# Altium integrated library Miscellaneous Devices LC.IntLib: 333 symbols (part 1 of 3) (continued)
## LMV321IDBVRG4_[C7972] (continued)
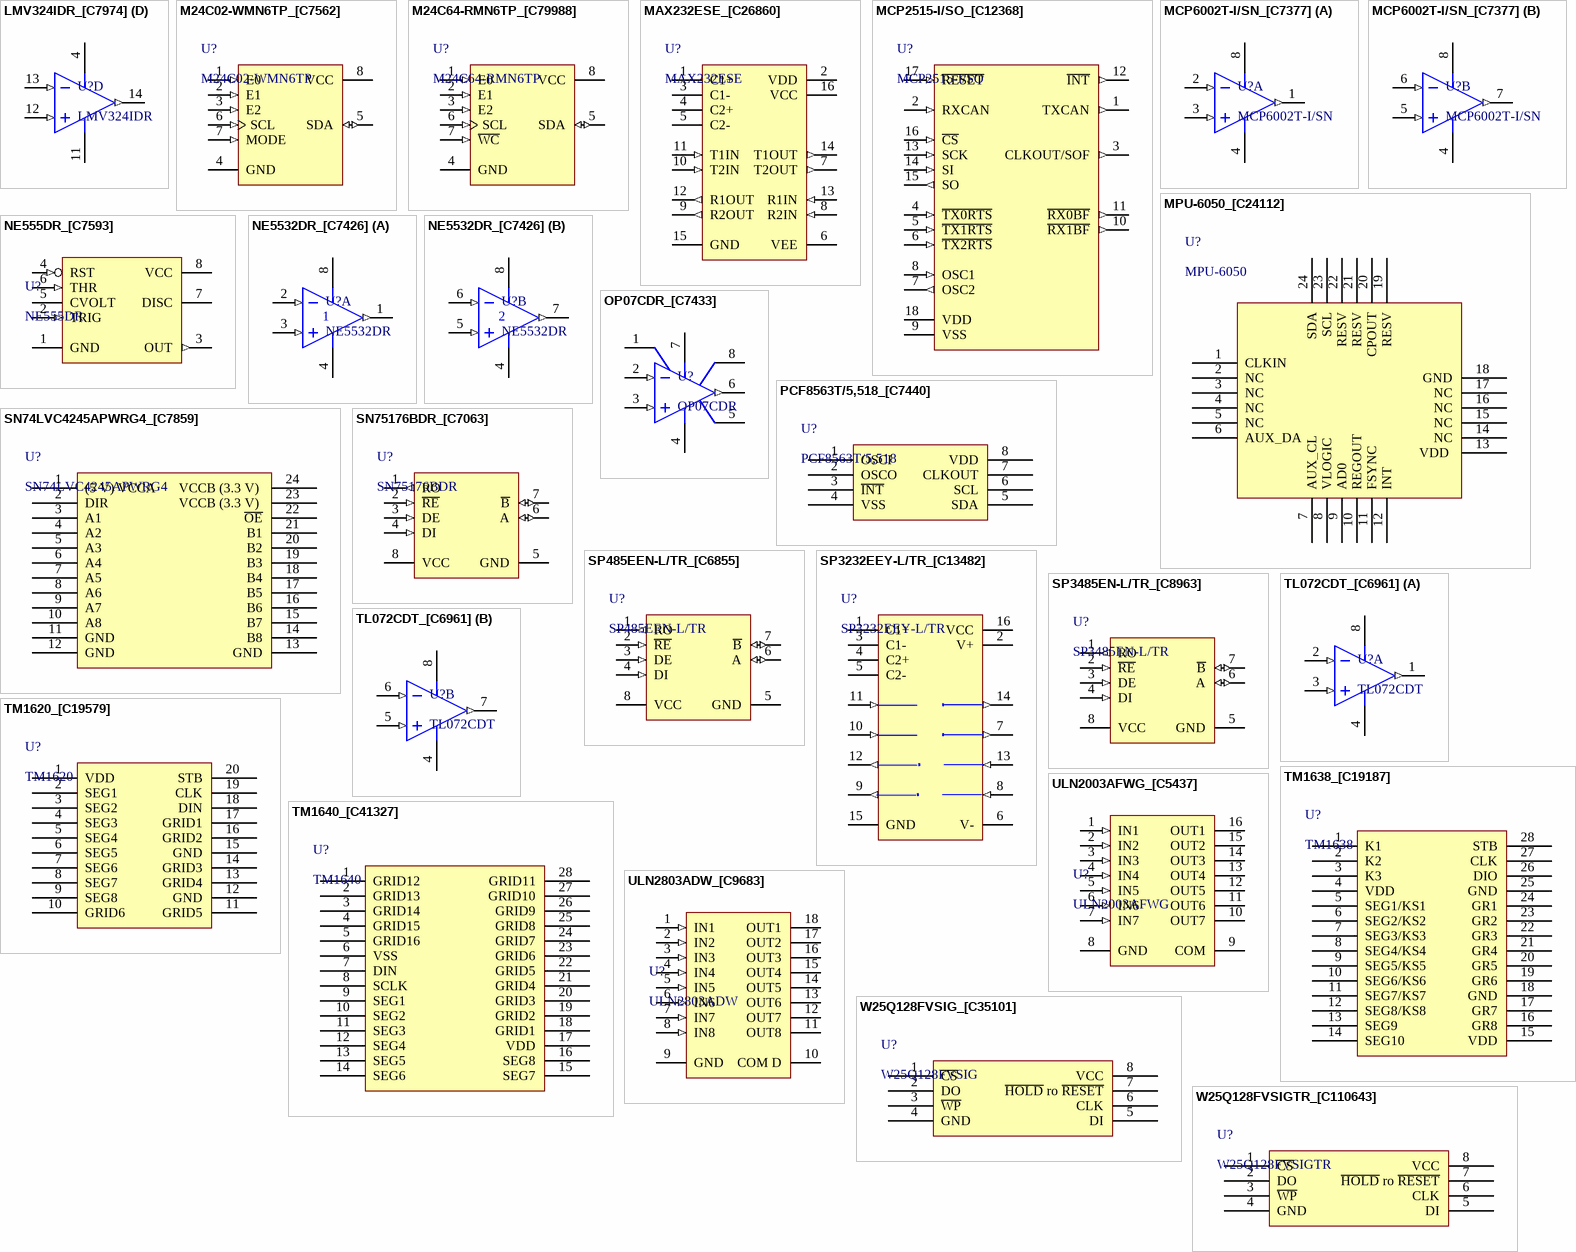
[diagram p4: symbols LMV324IDR_[C7974] to W25Q128FVSIGTR_[C110643]]

## LMV324IDR_[C7974]
designator U?, comment LMV324IDR
运放; ComponentLink1Description: 供应商链接; ComponentLink1URL: http://www.szlcsc.com/product/details_8451.html; Package: SOIC-14_150mil; Supplier: LC; SuppliersPartNumber: C7974
footprint SOIC-14_150mil
pins on every part: 4 V+ (power), 11 V- (power)
part A pins: 1 OUTA (out), 2 INA- (in), 3 INA+ (in)
part B pins: 5 INB+ (in), 6 INB- (in), 7 OUTB (out)
part C pins: 8 OUTC (out), 9 INC- (in), 10 INC+ (in)
part D pins: 12 IND+ (in), 13 IND- (in), 14 OUTD (out)

## M24C02-WMN6TP_[C7562]
designator U?, comment M24C02-WMN6TP
EEPROM; ComponentLink1Description: 供应商链接; ComponentLink1URL: http://www.szlcsc.com/product/details_8039.html; Package: SOIC-8_150mil; Supplier: LC; SuppliersPartNumber: C7562
footprint SOIC-8_150mil
pins: 1 E0 (in), 2 E1 (in), 3 E2 (in), 4 GND (power), 5 SDA (io), 6 SCL (in), 7 MODE (in), 8 VCC (power)

## M24C64-RMN6TP_[C79988]
designator U?, comment M24C64-RMN6TP
EEPROM; ComponentLink1Description: 供应商链接; ComponentLink1URL: http://www.szlcsc.com/product/details_81133.html; Package: SOIC-8_150mil; Supplier: LC; SuppliersPartNumber: C79988
footprint SOIC-8_150mil
pins: 1 E0 (in), 2 E1 (in), 3 E2 (in), 4 GND (power), 5 SDA (io), 6 SCL (in), 7 ~{WC} (in), 8 VCC (power)

## MAX232ESE_[C26860]
designator U?, comment MAX232ESE
RS232; ComponentLink1Description: 供应商链接; ComponentLink1URL: http://www.szlcsc.com/product/details_27608.html; Package: SOIC-16_150mil; Supplier: LC; SuppliersPartNumber: C26860
footprint SOIC-16_150mil
pins: 1 C1+, 2 VDD (power), 3 C1-, 4 C2+, 5 C2-, 6 VEE (power), 7 T2OUT (out), 8 R2IN (in), 9 R2OUT (out), 10 T2IN (in), 11 T1IN (in), 12 R1OUT (out), 13 R1IN (in), 14 T1OUT (out), 15 GND (power), 16 VCC (power)

## MCP2515-I/SO_[C12368]
designator U?, comment MCP2515-I/SO
CAN; ComponentLink1Description: 供应商链接; ComponentLink1URL: http://www.szlcsc.com/product/details_12992.html; Package: SOIC-18_300mil; Supplier: LC; SuppliersPartNumber: C12368
footprint SOIC-18_300mil
pins: 1 TXCAN (out), 2 RXCAN (in), 3 CLKOUT/SOF (out), 4 ~{TX0RTS} (in), 5 ~{TX1RTS} (in), 6 ~{TX2RTS} (in), 7 OSC2 (out), 8 OSC1 (in), 9 VSS (power), 10 ~{RX1BF} (out), 11 ~{RX0BF} (out), 12 ~{INT} (out), 13 SCK (in), 14 SI (in), 15 SO (out), 16 ~{CS} (in), 17 ~{RESET} (in), 18 VDD (power)

## MCP6002T-I/SN_[C7377]
designator U?, comment MCP6002T-I/SN
运放; ComponentLink1Description: 供应商链接; ComponentLink1URL: http://www.szlcsc.com/product/details_7854.html; Package: SOIC-8_150mil; Supplier: LC; SuppliersPartNumber: C7377
footprint SOIC-8_150mil
pins on every part: 4 VSS (power), 8 VDD (power)
part A pins: 1 VOUTA (out), 2 VINA- (in), 3 VINA+ (in)
part B pins: 5 VINB+ (in), 6 VINB- (in), 7 VOUTB (out)

## MPU-6050_[C24112]
designator U?, comment MPU-6050
传感器; ComponentLink1Description: 供应商链接; ComponentLink1URL: http://www.szlcsc.com/product/details_24852.html; Package: QFN-24_4x4x05P; Supplier: LC; SuppliersPartNumber: C24112
footprint QFN-24_4x4x05P
pins: 1 CLKIN, 2 NC, 3 NC, 4 NC, 5 NC, 6 AUX_DA, 7 AUX_CL, 8 VLOGIC, 9 AD0, 10 REGOUT, 11 FSYNC, 12 INT, 13 VDD , 14 NC, 15 NC, 16 NC, 17 NC, 18 GND, 19 RESV, 20 CPOUT, 21 RESV, 22 RESV, 23 SCL, 24 SDA

## NE555DR_[C7593]
designator U?, comment NE555DR
时基集成; ComponentLink1Description: 供应商链接; ComponentLink1URL: http://www.szlcsc.com/product/details_8070.html; Package: SOIC-8_150mil; Supplier: LC; SuppliersPartNumber: C7593
footprint SOIC-8_150mil
pins: 1 GND (power), 2 TRIG (in), 3 OUT (out), 4 RST (in), 5 CVOLT, 6 THR (in), 7 DISC (oc), 8 VCC (power)

## NE5532DR_[C7426]
designator U?, comment NE5532DR
功放; ComponentLink1Description: 供应商链接; ComponentLink1URL: http://www.szlcsc.com/product/details_7903.html; Package: SOIC-8_150mil; Supplier: LC; SuppliersPartNumber: C7426
footprint SOIC-8_150mil
pins on every part: 4 V- (power), 8 V+ (power)
part A pins: 1 OUT (out), 2 IN- (in), 3 IN+ (in)
part B pins: 5 IN+ (in), 6 IN- (in), 7 OUT (out)

## OP07CDR_[C7433]
designator U?, comment OP07CDR
精密运放; ComponentLink1Description: 供应商链接; ComponentLink1URL: http://www.szlcsc.com/product/details_7910.html; Package: SOIC-8; Supplier: LC; SuppliersPartNumber: C7433
footprint SOIC-8_150mil
pins: 1 VOSTRIM, 2 IN- (in), 3 IN+ (in), 4 V- (power), 5 NC, 6 OUT (out), 7 V+ (power), 8 VOSTRIM

## PCF8563T/5,518_[C7440]
designator U?, comment PCF8563T/5,518
实时时钟; ComponentLink1Description: 供应商链接; ComponentLink1URL: http://www.szlcsc.com/product/details_7917.html; Package: SOIC-8_150mil; Supplier: LC; SuppliersPartNumber: C7440
footprint SOIC-8_150mil
pins: 1 OSCI, 2 OSCO, 3 ~{INT}, 4 VSS, 5 SDA, 6 SCL, 7 CLKOUT, 8 VDD

## SN74LVC4245APWRG4_[C7859]
designator U?, comment SN74LVC4245APWRG4
74系列逻辑芯片; ComponentLink1Description: 供应商链接; ComponentLink1URL: http://www.szlcsc.com/product/details_8336.html; Package: TSSOP-24; Supplier: LC; SuppliersPartNumber: C7859
footprint TSSOP-24
pins: 1 (5 V) VCCA, 2 DIR, 3 A1, 4 A2, 5 A3, 6 A4, 7 A5, 8 A6, 9 A7, 10 A8, 11 GND, 12 GND, 13 GND, 14 B8, 15 B7, 16 B6, 17 B5, 18 B4, 19 B3, 20 B2, 21 B1, 22 ~{OE}, 23 VCCB (3.3 V) , 24 VCCB (3.3 V) 

## SN75176BDR_[C7063]
designator U?, comment SN75176BDR
RS-485/RS-422; ComponentLink1Description: 供应商链接; ComponentLink1URL: http://www.szlcsc.com/product/details_7535.html; Package: SOIC-8_150mil; Supplier: LC; SuppliersPartNumber: C7063
footprint SOIC-8_150mil
pins: 1 RO (out), 2 ~{RE} (in), 3 DE (in), 4 DI (in), 5 GND (power), 6 A (io), 7 ~{B} (io), 8 VCC (power)

## SP485EEN-L/TR_[C6855]
designator U?, comment SP485EEN-L/TR
RS-485/RS-422; ComponentLink1Description: 供应商链接; ComponentLink1URL: http://www.szlcsc.com/product/details_7327.html; Package: SOIC-8; Supplier: LC; SuppliersPartNumber: C6855
footprint SOIC-8_150mil
pins: 1 RO (out), 2 ~{RE} (in), 3 DE (in), 4 DI (in), 5 GND (power), 6 A (io), 7 ~{B} (io), 8 VCC (power)

## SP3232EEY-L/TR_[C13482]
designator U?, comment SP3232EEY-L/TR
RS232; ComponentLink1Description: 供应商链接; ComponentLink1URL: http://www.szlcsc.com/product/details_14131.html; Package: TSSOP-16; Supplier: LC; SuppliersPartNumber: C13482
footprint TSSOP-16
pins: 1 C1+, 2 V+ (power), 3 C1-, 4 C2+, 5 C2-, 6 V- (power), 7 T2OUT (out), 8 R2IN (in), 9 R2OUT (out), 10 T2IN (in), 11 T1IN (in), 12 R1OUT (out), 13 R1IN (in), 14 T1OUT (out), 15 GND (power), 16 VCC (power)

## SP3485EN-L/TR_[C8963]
designator U?, comment SP3485EN-L/TR
RS-485/RS-422; ComponentLink1Description: 供应商链接; ComponentLink1URL: http://www.szlcsc.com/product/details_9482.html; Package: SOIC-8; Supplier: LC; SuppliersPartNumber: C8963
footprint SOIC-8_150mil
pins: 1 RO (out), 2 ~{RE} (in), 3 DE (in), 4 DI (in), 5 GND (power), 6 A (io), 7 ~{B} (io), 8 VCC (power)

## TL072CDT_[C6961]
designator U?, comment TL072CDT
运放; ComponentLink1Description: 供应商链接; ComponentLink1URL: http://www.szlcsc.com/product/details_7433.html; Package: SOIC-8_150mil; Supplier: LC; SuppliersPartNumber: C6961
footprint SOIC-8_150mil
pins on every part: 4 V- (power), 8 V+ (power)
part A pins: 1 OUT (out), 2 IN- (in), 3 IN+ (in)
part B pins: 5 IN+ (in), 6 IN- (in), 7 OUT (out)

## TM1620_[C19579]
designator U?, comment TM1620
LED驱动; ComponentLink1Description: 供应商链接; ComponentLink1URL: http://www.szlcsc.com/product/details_20288.html; Package: SOIC-20_300mil; Supplier: LC; SuppliersPartNumber: C19579
footprint SOIC-20_300mil
pins: 1 VDD, 2 SEG1, 3 SEG2, 4 SEG3, 5 SEG4, 6 SEG5, 7 SEG6, 8 SEG7, 9 SEG8, 10 GRID6, 11 GRID5, 12 GND, 13 GRID4, 14 GRID3, 15 GND, 16 GRID2, 17 GRID1, 18 DIN, 19 CLK, 20 STB

## TM1638_[C19187]
designator U?, comment TM1638
LED驱动; ComponentLink1Description: 供应商链接; ComponentLink1URL: http://www.szlcsc.com/product/details_19892.html; Package: SOIC-28_300mil; Supplier: LC; SuppliersPartNumber: C19187
footprint SOIC-28_300mil
pins: 1 K1, 2 K2, 3 K3, 4 VDD, 5 SEG1/KS1, 6 SEG2/KS2, 7 SEG3/KS3, 8 SEG4/KS4, 9 SEG5/KS5, 10 SEG6/KS6, 11 SEG7/KS7, 12 SEG8/KS8, 13 SEG9, 14 SEG10, 15 VDD, 16 GR8, 17 GR7, 18 GND, 19 GR6, 20 GR5, 21 GR4, 22 GR3, 23 GR2, 24 GR1, 25 GND, 26 DIO, 27 CLK, 28 STB

## TM1640_[C41327]
designator U?, comment TM1640
LED驱动; ComponentLink1Description: 供应商链接; ComponentLink1URL: http://www.szlcsc.com/product/details_42311.html; Package: SOP-28_300mil; Supplier: LC; SuppliersPartNumber: C41327
footprint SOP-28_300mil
pins: 1 GRID12, 2 GRID13, 3 GRID14, 4 GRID15, 5 GRID16, 6 VSS, 7 DIN, 8 SCLK, 9 SEG1, 10 SEG2, 11 SEG3, 12 SEG4, 13 SEG5, 14 SEG6, 15 SEG7, 16 SEG8, 17 VDD, 18 GRID1, 19 GRID2, 20 GRID3, 21 GRID4, 22 GRID5, 23 GRID6, 24 GRID7, 25 GRID8, 26 GRID9, 27 GRID10, 28 GRID11

## ULN2003AFWG_[C5437]
designator U?, comment ULN2003AFWG
大电流驱动; ComponentLink1Description: 供应商链接; ComponentLink1URL: http://www.szlcsc.com/product/details_5880.html; Package: SOIC-16_150mil; Supplier: LC; SuppliersPartNumber: C5437
footprint SOIC-16_150mil
pins: 1 IN1 (in), 2 IN2 (in), 3 IN3 (in), 4 IN4 (in), 5 IN5 (in), 6 IN6 (in), 7 IN7 (in), 8 GND (power), 9 COM, 10 OUT7 (oc), 11 OUT6 (oc), 12 OUT5 (oc), 13 OUT4 (oc), 14 OUT3 (oc), 15 OUT2 (oc), 16 OUT1 (oc)

## ULN2803ADW_[C9683]
designator U?, comment ULN2803ADW
大电流驱动; ComponentLink1Description: 供应商链接; ComponentLink1URL: http://www.szlcsc.com/product/details_10213.html; Package: SOIC-18_300mil; Supplier: LC; SuppliersPartNumber: C9683
footprint SOIC-18_300mil
pins: 1 IN1 (in), 2 IN2 (in), 3 IN3 (in), 4 IN4 (in), 5 IN5 (in), 6 IN6 (in), 7 IN7 (in), 8 IN8 (in), 9 GND (power), 10 COM D, 11 OUT8 (oc), 12 OUT7 (oc), 13 OUT6 (oc), 14 OUT5 (oc), 15 OUT4 (oc), 16 OUT3 (oc), 17 OUT2 (oc), 18 OUT1 (oc)

## W25Q128FVSIG_[C35101]
designator U?, comment W25Q128FVSIG
Flash ROM; ComponentLink1Description: 供应商链接; ComponentLink1URL: http://www.szlcsc.com/product/details_36072.html; Package: SOIC-8; Supplier: LC; SuppliersPartNumber: C35101
footprint SOIC-8_208mil
pins: 1 ~{CS}, 2 DO, 3 ~{WP}, 4 GND, 5 DI, 6 CLK, 7 ~{HOLD} ro ~{RESET}, 8 VCC

## W25Q128FVSIGTR_[C110643]
designator U?, comment W25Q128FVSIGTR
Flash ROM; ComponentLink1Description: 供应商链接; ComponentLink1URL: http://www.szlcsc.com/product/details_111868.html; Package: SOIC-8; Supplier: LC; SuppliersPartNumber: C110643
footprint SOIC-8_208mil
pins: 1 ~{CS}, 2 DO, 3 ~{WP}, 4 GND, 5 DI, 6 CLK, 7 ~{HOLD} ro ~{RESET}, 8 VCC

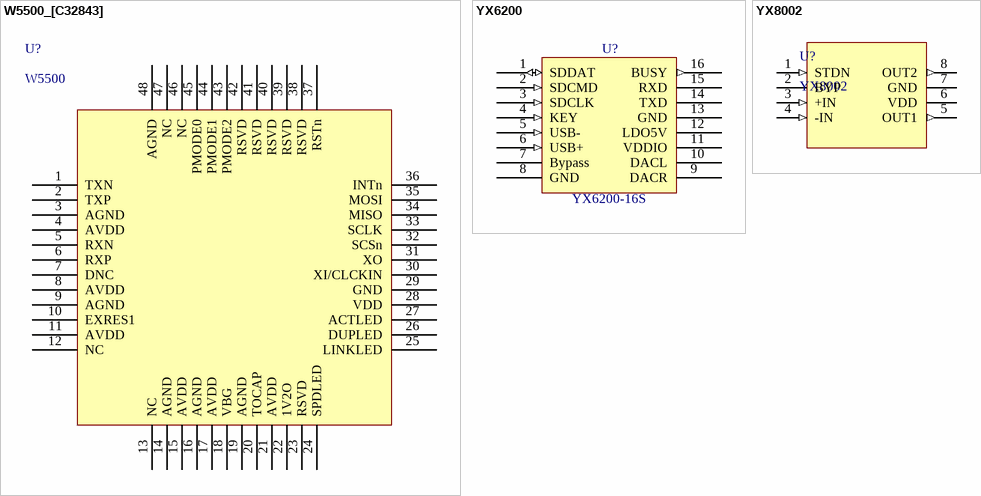
[diagram p5: symbols W5500_[C32843] to YX8002]

## W5500_[C32843]
designator U?, comment W5500
以太网; ComponentLink1Description: 供应商链接; ComponentLink1URL: http://www.szlcsc.com/product/details_33808.html; Package: LQFP-48_7x7x05P; Supplier: LC; SuppliersPartNumber: C32843
footprint LQFP-48_7x7x05P
pins: 1 TXN, 2 TXP, 3 AGND, 4 AVDD, 5 RXN, 6 RXP, 7 DNC, 8 AVDD, 9 AGND, 10 EXRES1, 11 AVDD, 12 NC, 13 NC, 14 AGND, 15 AVDD, 16 AGND, 17 AVDD, 18 VBG, 19 AGND, 20 TOCAP, 21 AVDD, 22 1V2O, 23 RSVD, 24 SPDLED, 25 LINKLED, 26 DUPLED, 27 ACTLED, 28 VDD, 29 GND, 30 XI/CLCKIN, 31 XO, 32 SCSn, 33 SCLK, 34 MISO, 35 MOSI, 36 INTn, 37 RSTn, 38 RSVD, 39 RSVD, 40 RSVD, 41 RSVD, 42 RSVD, 43 PMODE2, 44 PMODE1, 45 PMODE0, 46 NC, 47 NC, 48 AGND

## YX6200
designator U?, comment YX6200-16S
ComponentLink1Description: 生产商; ComponentLink1URL: https://www.yxin18.com/product/product-11-892.html
footprint SOP-16_150mil
pins: 1 SDDAT (io), 2 SDCMD (in), 3 SDCLK (in), 4 KEY (in), 5 USB- (in), 6 USB+ (in), 7 Bypass, 8 GND (power), 9 DACR, 10 DACL, 11 VDDIO, 12 LDO5V, 13 GND, 14 TXD, 15 RXD, 16 BUSY (out)
2 alternate drawings of the same symbol

## YX8002
designator U?
音频功放; Package: SOIC-8_150mil; Supplier: LC; SuppliersPartNumber: C7593
footprint SOIC-8_150mil
pins: 1 STDN (in), 2 BYP, 3 +IN (in), 4 -IN (in), 5 OUT1 (out), 6 VDD (power), 7 GND (power), 8 OUT2 (out)


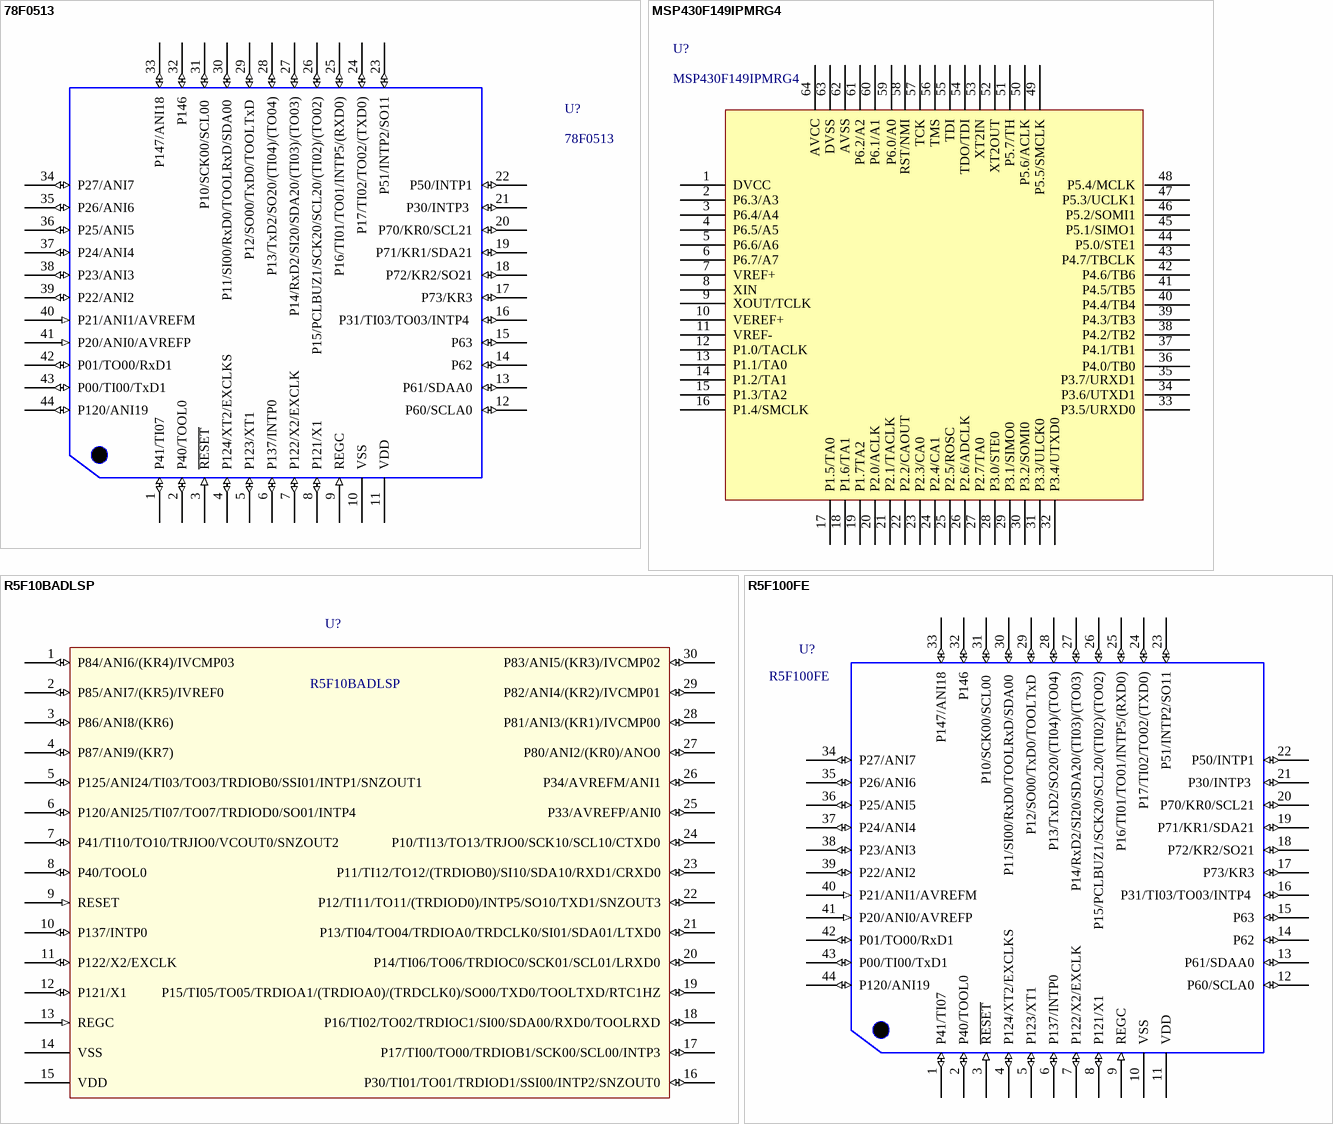
[diagram p6: symbols 78F0513 to R5F100FE]

## 78F0513
designator U?
MCU
footprint QFP10X10-G44/P.8N
pins: 1 P41/TI07  (io), 2 P40/TOOL0 (io), 3 ~{RESET} (in), 4 P124/XT2/EXCLKS (io), 5 P123/XT1 (io), 6 P137/INTP0 (io), 7 P122/X2/EXCLK (io), 8 P121/X1 (io), 9 REGC (in), 10 VSS (power), 11 VDD (power), 12 P60/SCLA0 (io), 13 P61/SDAA0 (io), 14 P62 (io), 15 P63 (io), 16 P31/TI03/TO03/INTP4  (io), 17 P73/KR3 (io), 18 P72/KR2/SO21 (io), 19 P71/KR1/SDA21 (io), 20 P70/KR0/SCL21 (io), 21 P30/INTP3  (io), 22 P50/INTP1 (io), 23 P51/INTP2/SO11 (io), 24 P17/TI02/TO02/(TXD0) (io), 25 P16/TI01/TO01/INTP5/(RXD0) (io), 26 P15/PCLBUZ1/SCK20/SCL20/(TI02)/(TO02) (io), 27 P14/RxD2/SI20/SDA20/(TI03)/(TO03) (io), 28 P13/TxD2/SO20/(TI04)/(TO04) (io), 29 P12/SO00/TxD0/TOOLTxD  (io), 30 P11/SI00/RxD0/TOOLRxD/SDA00  (io), 31 P10/SCK00/SCL00  (io), 32 P146 (io), 33 P147/ANI18 (io), 34 P27/ANI7 (io), 35 P26/ANI6 (io), 36 P25/ANI5 (io), 37 P24/ANI4 (io), 38 P23/ANI3 (io), 39 P22/ANI2 (io), 40 P21/ANI1/AVREFM (in), 41 P20/ANI0/AVREFP (in), 42 P01/TO00/RxD1 (io), 43 P00/TI00/TxD1 (io), 44 P120/ANI19 (io)

## MSP430F149IPMRG4
designator U?
MCU; ComponentLink1Description: 供应商链接; ComponentLink1URL: http://www.szlcsc.com/product/details_8068.html; Package: LQFP-64_10x10x05P; Supplier: LC; SuppliersPartNumber: C7591
footprint LQFP-64_10x10x05P_Q2 (编带PIN1 在 Q2)
pins: 1 DVCC, 2 P6.3/A3, 3 P6.4/A4, 4 P6.5/A5, 5 P6.6/A6, 6 P6.7/A7, 7 VREF+, 8 XIN, 9 XOUT/TCLK, 10 VEREF+, 11 VREF-, 12 P1.0/TACLK, 13 P1.1/TA0, 14 P1.2/TA1, 15 P1.3/TA2, 16 P1.4/SMCLK, 17 P1.5/TA0, 18 P1.6/TA1, 19 P1.7TA2, 20 P2.0/ACLK, 21 P2.1/TACLK, 22 P2.2/CAOUT, 23 P2.3/CA0, 24 P2.4/CA1, 25 P2.5/ROSC, 26 P2.6/ADCLK, 27 P2.7/TA0, 28 P3.0/STE0, 29 P3.1/SIMO0, 30 P3.2/SOMI0, 31 P3.3/ULCK0, 32 P3.4/UTXD0, 33 P3.5/URXD0, 34 P3.6/UTXD1, 35 P3.7/URXD1, 36 P4.0/TB0, 37 P4.1/TB1, 38 P4.2/TB2, 39 P4.3/TB3, 40 P4.4/TB4, 41 P4.5/TB5, 42 P4.6/TB6, 43 P4.7/TBCLK, 44 P5.0/STE1, 45 P5.1/SIMO1, 46 P5.2/SOMI1, 47 P5.3/UCLK1, 48 P5.4/MCLK, 49 P5.5/SMCLK, 50 P5.6/ACLK, 51 P5.7/TH, 52 XT2OUT, 53 XT2IN, 54 TDO/TDI, 55 TDI, 56 TMS, 57 TCK, 58 RST/NMI, 59 P6.0/A0, 60 P6.1/A1, 61 P6.2/A2, 62 AVSS, 63 DVSS, 64 AVCC

## R5F10BADLSP
designator U?
MCU
pins: 1 P84/ANI6/(KR4)/IVCMP03 (io), 2 P85/ANI7/(KR5)/IVREF0 (io), 3 P86/ANI8/(KR6) (io), 4 P87/ANI9/(KR7) (io), 5 P125/ANI24/TI03/TO03/TRDIOB0/SSI01/INTP1/SNZOUT1 (io), 6 P120/ANI25/TI07/TO07/TRDIOD0/SO01/INTP4 (io), 7 P41/TI10/TO10/TRJIO0/VCOUT0/SNZOUT2 (io), 8 P40/TOOL0 (io), 9 RESET (in), 10 P137/INTP0 (io), 11 P122/X2/EXCLK (io), 12 P121/X1 (io), 13 REGC (in), 14 VSS (power), 15 VDD (power), 16 P30/TI01/TO01/TRDIOD1/SSI00/INTP2/SNZOUT0 (io), 17 P17/TI00/TO00/TRDIOB1/SCK00/SCL00/INTP3 (io), 18 P16/TI02/TO02/TRDIOC1/SI00/SDA00/RXD0/TOOLRXD (io), 19 P15/TI05/TO05/TRDIOA1/(TRDIOA0)/(TRDCLK0)/SO00/TXD0/TOOLTXD/RTC1HZ (io), 20 P14/TI06/TO06/TRDIOC0/SCK01/SCL01/LRXD0 (io), 21 P13/TI04/TO04/TRDIOA0/TRDCLK0/SI01/SDA01/LTXD0 (io), 22 P12/TI11/TO11/(TRDIOD0)/INTP5/SO10/TXD1/SNZOUT3 (io), 23 P11/TI12/TO12/(TRDIOB0)/SI10/SDA10/RXD1/CRXD0 (io), 24 P10/TI13/TO13/TRJO0/SCK10/SCL10/CTXD0 (io), 25 P33/AVREFP/ANI0 (io), 26 P34/AVREFM/ANI1 (io), 27 P80/ANI2/(KR0)/ANO0 (io), 28 P81/ANI3/(KR1)/IVCMP00 (io), 29 P82/ANI4/(KR2)/IVCMP01 (io), 30 P83/ANI5/(KR3)/IVCMP02 (io)

## R5F100FE
designator U?
MCU; Supplier 1: Digi-Key
footprint LQFP-44_10X10-G44/P.8N
pins: 1 P41/TI07  (io), 2 P40/TOOL0 (io), 3 ~{RESET} (in), 4 P124/XT2/EXCLKS (io), 5 P123/XT1 (io), 6 P137/INTP0 (io), 7 P122/X2/EXCLK (io), 8 P121/X1 (io), 9 REGC (in), 10 VSS (power), 11 VDD (power), 12 P60/SCLA0 (io), 13 P61/SDAA0 (io), 14 P62 (io), 15 P63 (io), 16 P31/TI03/TO03/INTP4  (io), 17 P73/KR3 (io), 18 P72/KR2/SO21 (io), 19 P71/KR1/SDA21 (io), 20 P70/KR0/SCL21 (io), 21 P30/INTP3  (io), 22 P50/INTP1 (io), 23 P51/INTP2/SO11 (io), 24 P17/TI02/TO02/(TXD0) (io), 25 P16/TI01/TO01/INTP5/(RXD0) (io), 26 P15/PCLBUZ1/SCK20/SCL20/(TI02)/(TO02) (io), 27 P14/RxD2/SI20/SDA20/(TI03)/(TO03) (io), 28 P13/TxD2/SO20/(TI04)/(TO04) (io), 29 P12/SO00/TxD0/TOOLTxD  (io), 30 P11/SI00/RxD0/TOOLRxD/SDA00  (io), 31 P10/SCK00/SCL00  (io), 32 P146 (io), 33 P147/ANI18 (io), 34 P27/ANI7 (io), 35 P26/ANI6 (io), 36 P25/ANI5 (io), 37 P24/ANI4 (io), 38 P23/ANI3 (io), 39 P22/ANI2 (io), 40 P21/ANI1/AVREFM (in), 41 P20/ANI0/AVREFP (in), 42 P01/TO00/RxD1 (io), 43 P00/TI00/TxD1 (io), 44 P120/ANI19 (io)

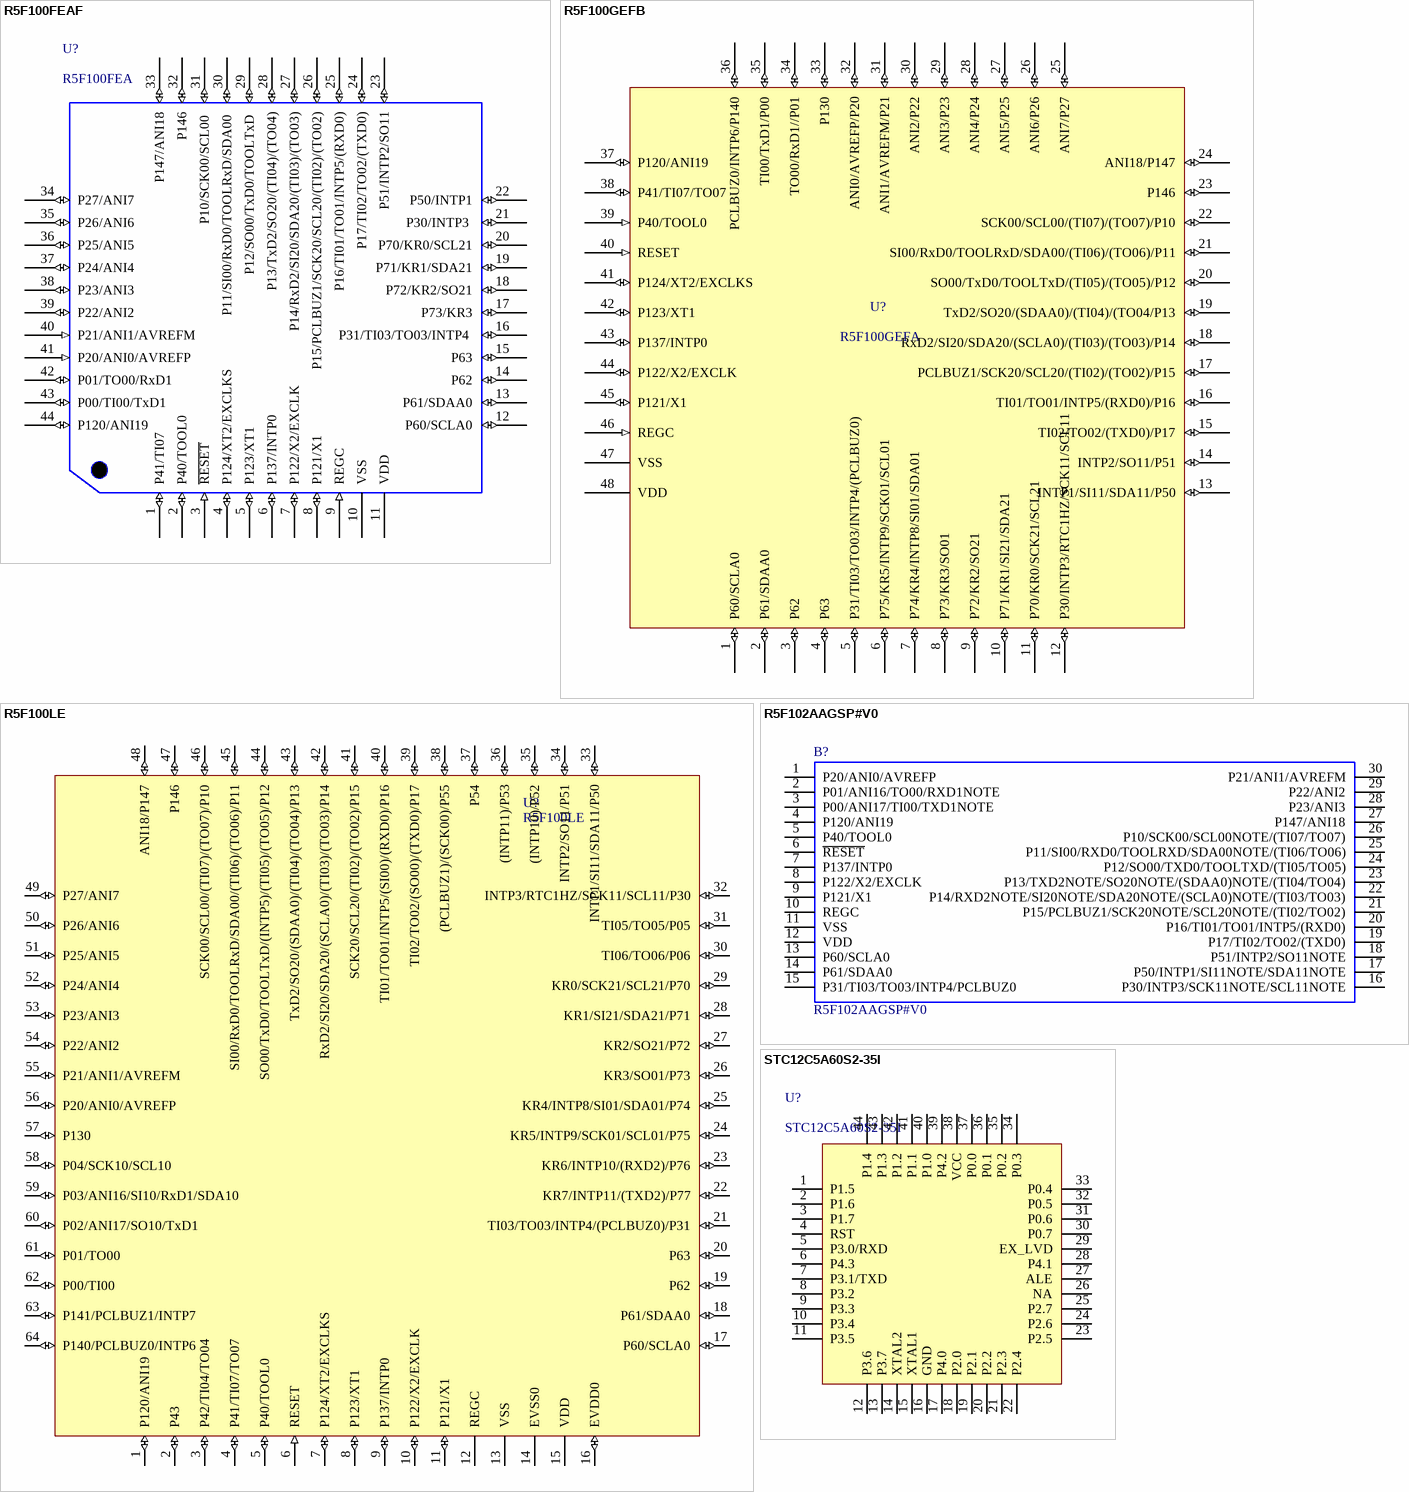
[diagram p7: symbols R5F100FEAF to STC12C5A60S2-35I]

## R5F100FEAF
designator U?, comment R5F100FEA
MCU
footprint LQFP-44_10X10-G44/P.8N
pins: 1 P41/TI07  (io), 2 P40/TOOL0 (io), 3 ~{RESET} (in), 4 P124/XT2/EXCLKS (io), 5 P123/XT1 (io), 6 P137/INTP0 (io), 7 P122/X2/EXCLK (io), 8 P121/X1 (io), 9 REGC (in), 10 VSS (power), 11 VDD (power), 12 P60/SCLA0 (io), 13 P61/SDAA0 (io), 14 P62 (io), 15 P63 (io), 16 P31/TI03/TO03/INTP4  (io), 17 P73/KR3 (io), 18 P72/KR2/SO21 (io), 19 P71/KR1/SDA21 (io), 20 P70/KR0/SCL21 (io), 21 P30/INTP3  (io), 22 P50/INTP1 (io), 23 P51/INTP2/SO11 (io), 24 P17/TI02/TO02/(TXD0) (io), 25 P16/TI01/TO01/INTP5/(RXD0) (io), 26 P15/PCLBUZ1/SCK20/SCL20/(TI02)/(TO02) (io), 27 P14/RxD2/SI20/SDA20/(TI03)/(TO03) (io), 28 P13/TxD2/SO20/(TI04)/(TO04) (io), 29 P12/SO00/TxD0/TOOLTxD  (io), 30 P11/SI00/RxD0/TOOLRxD/SDA00  (io), 31 P10/SCK00/SCL00  (io), 32 P146 (io), 33 P147/ANI18 (io), 34 P27/ANI7 (io), 35 P26/ANI6 (io), 36 P25/ANI5 (io), 37 P24/ANI4 (io), 38 P23/ANI3 (io), 39 P22/ANI2 (io), 40 P21/ANI1/AVREFM (in), 41 P20/ANI0/AVREFP (in), 42 P01/TO00/RxD1 (io), 43 P00/TI00/TxD1 (io), 44 P120/ANI19 (io)

## R5F100GEFB
designator U?, comment R5F100GEFA
单片机
footprint LQFP-48_7x7x05P
footprint LQFP48
pins: 1 P60/SCLA0 (io), 2 P61/SDAA0 (io), 3 P62 (io), 4 P63 (io), 5 P31/TI03/TO03/INTP4/(PCLBUZ0) (io), 6 P75/KR5/INTP9/SCK01/SCL01 (io), 7 P74/KR4/INTP8/SI01/SDA01 (io), 8 P73/KR3/SO01 (io), 9 P72/KR2/SO21 (io), 10 P71/KR1/SI21/SDA21 (io), 11 P70/KR0/SCK21/SCL21 (io), 12 P30/INTP3/RTC1HZ/SCK11/SCL11 (io), 13 INTP1/SI11/SDA11/P50 (io), 14 INTP2/SO11/P51 (io), 15 TI02/TO02/(TXD0)/P17 (io), 16 TI01/TO01/INTP5/(RXD0)/P16 (io), 17 PCLBUZ1/SCK20/SCL20/(TI02)/(TO02)/P15 (io), 18 RxD2/SI20/SDA20/(SCLA0)/(TI03)/(TO03)/P14 (io), 19 TxD2/SO20/(SDAA0)/(TI04)/(TO04/P13 (io), 20 SO00/TxD0/TOOLTxD/(TI05)/(TO05)/P12 (io), 21 SI00/RxD0/TOOLRxD/SDA00/(TI06)/(TO06)/P11 (io), 22 SCK00/SCL00/(TI07)/(TO07)/P10 (io), 23 P146 (io), 24 ANI18/P147 (io), 25 ANI7/P27 (io), 26 ANI6/P26 (io), 27 ANI5/P25 (io), 28 ANI4/P24 (io), 29 ANI3/P23 (io), 30 ANI2/P22 (io), 31 ANI1/AVREFM/P21 (io), 32 ANI0/AVREFP/P20 (io), 33 P130 (io), 34 TO00/RxD1//P01 (io), 35 TI00/TxD1/P00 (io), 36 PCLBUZ0/INTP6/P140 (io), 37 P120/ANI19 (io), 38 P41/TI07/TO07 (io), 39 P40/TOOL0 (in), 40 RESET (in), 41 P124/XT2/EXCLKS (io), 42 P123/XT1 (io), 43 P137/INTP0 (io), 44 P122/X2/EXCLK (io), 45 P121/X1 (io), 46 REGC (in), 47 VSS (power), 48 VDD (power)

## R5F100LE
designator U?
MCU; Supplier 1: Digi-Key
footprint LQFP-64_10x10x05P
pins: 1 P120/ANI19 (io), 2 P43 (io), 3 P42/TI04/TO04 (io), 4 P41/TI07/TO07 (io), 5 P40/TOOL0 (io), 6 RESET (in), 7 P124/XT2/EXCLKS (io), 8 P123/XT1 (io), 9 P137/INTP0 (io), 10 P122/X2/EXCLK (io), 11 P121/X1 (io), 12 REGC (power), 13 VSS (power), 14 EVSS0 (power), 15 VDD (power), 16 EVDD0 (io), 17 P60/SCLA0 (io), 18 P61/SDAA0 (io), 19 P62 (io), 20 P63 (io), 21 TI03/TO03/INTP4/(PCLBUZ0)/P31 (io), 22 KR7/INTP11/(TXD2)/P77 (io), 23 KR6/INTP10/(RXD2)/P76 (io), 24 KR5/INTP9/SCK01/SCL01/P75 (io), 25 KR4/INTP8/SI01/SDA01/P74 (io), 26 KR3/SO01/P73 (io), 27 KR2/SO21/P72 (io), 28 KR1/SI21/SDA21/P71 (io), 29 KR0/SCK21/SCL21/P70 (io), 30 TI06/TO06/P06 (io), 31 TI05/TO05/P05 (io), 32 INTP3/RTC1HZ/SCK11/SCL11/P30 (io), 33 INTP1/SI11/SDA11/P50 (io), 34 INTP2/SO11/P51 (io), 35 (INTP10)/P52 (io), 36 (INTP11)/P53 (io), 37 P54 (io), 38 (PCLBUZ1)/(SCK00)/P55 (io), 39 TI02/TO02/(SO00)/(TXD0)/P17 (io), 40 TI01/TO01/INTP5/(SI00)/(RXD0)/P16 (io), 41 SCK20/SCL20/(TI02)/(TO02)/P15 (io), 42 RxD2/SI20/SDA20/(SCLA0)/(TI03)/(TO03)/P14 (io), 43 TxD2/SO20/(SDAA0)/(TI04)/(TO04)/P13 (io), 44 SO00/TxD0/TOOLTxD/(INTP5)/(TI05)/(TO05)/P12 (io), 45 SI00/RxD0/TOOLRxD/SDA00/(TI06)/(TO06)/P11 (io), 46 SCK00/SCL00/(TI07)/(TO07)/P10 (io), 47 P146 (io), 48 ANI18/P147 (io), 49 P27/ANI7 (io), 50 P26/ANI6 (io), 51 P25/ANI5 (io), 52 P24/ANI4 (io), 53 P23/ANI3 (io), 54 P22/ANI2 (io), 55 P21/ANI1/AVREFM (io), 56 P20/ANI0/AVREFP (io), 57 P130 (io), 58 P04/SCK10/SCL10 (io), 59 P03/ANI16/SI10/RxD1/SDA10 (io), 60 P02/ANI17/SO10/TxD1 (io), 61 P01/TO00 (io), 62 P00/TI00 (io), 63 P141/PCLBUZ1/INTP7 (io), 64 P140/PCLBUZ0/INTP6 (io)

## R5F102AAGSP#V0
designator B?
Renesas Electronics R5F102AAGSP#V0 RL78 Microcontroller, 24MHz, 16 kB Flash, 30-Pin LSSOP; Geometry.Height: 1.4mm; Manufacturer_Name: Renesas Electronics; Manufacturer_Part_Number: R5F102AAGSP#V0; Mouser Part Number: 968-R5F102AAGSP#V0; Mouser Price/Stock: https://www.mouser.com/Search/Refine.aspx?Keyword=968-R5F102AAGSP%23V0; RS Part Number: 1258089P; RS Price/Stock: http://uk.rs-online.com/web/p/products/1258089P; Datasheet Link: https://www.renesas.com/us/en/doc/products/mpumcu/doc/rl78/r01ds0193ej0220_rl78g12.pdf
footprint SOP65P810X140-30N
pins: 1 P20/ANI0/AVREFP, 2 P01/ANI16/TO00/RXD1NOTE, 3 P00/ANI17/TI00/TXD1NOTE, 4 P120/ANI19, 5 P40/TOOL0, 6 ~{RESET}, 7 P137/INTP0, 8 P122/X2/EXCLK, 9 P121/X1, 10 REGC, 11 VSS, 12 VDD, 13 P60/SCLA0, 14 P61/SDAA0, 15 P31/TI03/TO03/INTP4/PCLBUZ0, 16 P30/INTP3/SCK11NOTE/SCL11NOTE, 17 P50/INTP1/SI11NOTE/SDA11NOTE, 18 P51/INTP2/SO11NOTE, 19 P17/TI02/TO02/(TXD0), 20 P16/TI01/TO01/INTP5/(RXD0), 21 P15/PCLBUZ1/SCK20NOTE/SCL20NOTE/(TI02/TO02), 22 P14/RXD2NOTE/SI20NOTE/SDA20NOTE/(SCLA0)NOTE/(TI03/TO03), 23 P13/TXD2NOTE/SO20NOTE/(SDAA0)NOTE/(TI04/TO04), 24 P12/SO00/TXD0/TOOLTXD/(TI05/TO05), 25 P11/SI00/RXD0/TOOLRXD/SDA00NOTE/(TI06/TO06), 26 P10/SCK00/SCL00NOTE/(TI07/TO07), 27 P147/ANI18, 28 P23/ANI3, 29 P22/ANI2, 30 P21/ANI1/AVREFM

## STC12C5A60S2-35I
designator U?
MCU; ComponentLink1Description: 供应商链接; ComponentLink1URL: http://www.szlcsc.com/product/details_9202.html; Package: LQFP-44_10x10x08P; Supplier: LC; SuppliersPartNumber: C8696
footprint LQFP-44_10x10x08P
pins: 1 P1.5, 2 P1.6, 3 P1.7, 4 RST, 5 P3.0/RXD, 6 P4.3, 7 P3.1/TXD, 8 P3.2, 9 P3.3, 10 P3.4, 11 P3.5, 12 P3.6, 13 P3.7, 14 XTAL2, 15 XTAL1, 16 GND (power), 17 P4.0, 18 P2.0, 19 P2.1, 20 P2.2, 21 P2.3, 22 P2.4, 23 P2.5, 24 P2.6, 25 P2.7, 26 NA, 27 ALE, 28 P4.1, 29 EX_LVD, 30 P0.7, 31 P0.6, 32 P0.5, 33 P0.4, 34 P0.3, 35 P0.2, 36 P0.1, 37 P0.0, 38 VCC (power), 39 P4.2, 40 P1.0, 41 P1.1, 42 P1.2, 43 P1.3, 44 P1.4
